# Altium footprint library BaseBoard.PcbLib: 128 footprints (part 2 of 8)
Each footprint in its own frame and in the unit in brackets; x right, y up, seen from the top. Pads: shape width x height; smd on the part's side, far side on the other; paste and mask are expansions set on the pad; w line width, h text height; cw(c..) or ccw(c..) is an arc to the next point about the centre after c.
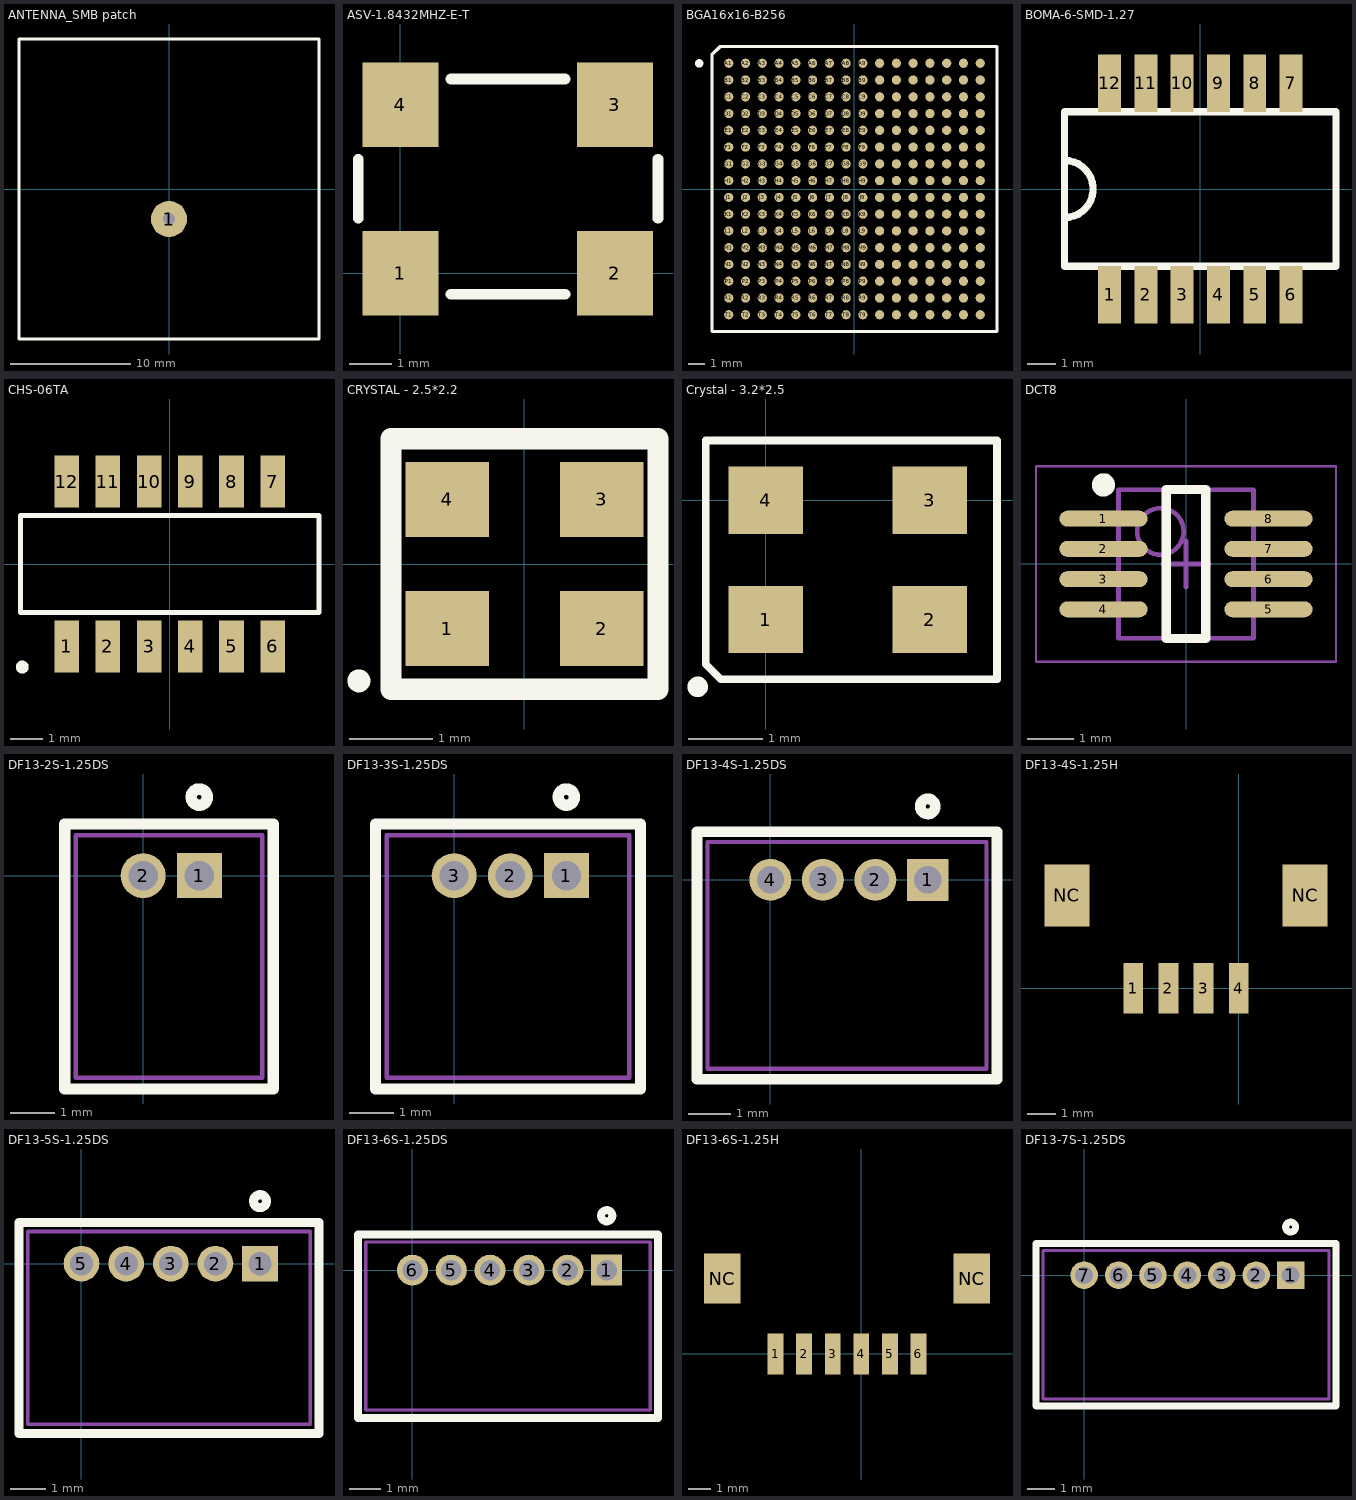
[diagram p1: the footprints below, top view; thin cyan lines are the x and y axes]

## ANTENNA_SMB patch [mm]
pads (1):
  round 3 hole 1: 1(0,-2.5)
Top Overlay:
  lines w0.254: -12.5,-12.5 12.5,-12.5 12.5,12.5 -12.5,12.5 -12.5,-12.5

## ASV-1.8432MHZ-E-T [mil]
pads (4):
  rect 71x79 smd: 1(0,0) 2(200,0) 3(200,157) 4(0,157)
Top Overlay:
  lines w10: -39.37,51.18 -39.37,106.3 ; 47.24,-19.68 153.54,-19.68 ; 47.24,181.1 153.54,181.1 ; 240.16,51.18 240.16,106.3
3D body "ASV.STEP": height 71.43, standoff 0.57, extent -37.39,-21.25 238.2,178.75

## BGA16x16-B256 [mm]
pads (256):
  round 0.55 smd: A1(-7.5,7.5) A2(-6.5,7.5) A3(-5.5,7.5) A4(-4.5,7.5) A5(-3.5,7.5) A6(-2.5,7.5) A7(-1.5,7.5) A8(-0.5,7.5) A9(0.5,7.5) A10(1.5,7.5) A11(2.5,7.5) A12(3.5,7.5) A13(4.5,7.5) A14(5.5,7.5) A15(6.5,7.5) A16(7.5,7.5) B1(-7.5,6.5) B2(-6.5,6.5) B3(-5.5,6.5) B4(-4.5,6.5) B5(-3.5,6.5) B6(-2.5,6.5) B7(-1.5,6.5) B8(-0.5,6.5) B9(0.5,6.5) B10(1.5,6.5) B11(2.5,6.5) B12(3.5,6.5) B13(4.5,6.5) B14(5.5,6.5) B15(6.5,6.5) B16(7.5,6.5) C1(-7.5,5.5) C2(-6.5,5.5) C3(-5.5,5.5) C4(-4.5,5.5) C5(-3.5,5.5) C6(-2.5,5.5) C7(-1.5,5.5) C8(-0.5,5.5) C9(0.5,5.5) C10(1.5,5.5) C11(2.5,5.5) C12(3.5,5.5) C13(4.5,5.5) C14(5.5,5.5) C15(6.5,5.5) C16(7.5,5.5) D1(-7.5,4.5) D2(-6.5,4.5) D3(-5.5,4.5) D4(-4.5,4.5) D5(-3.5,4.5) D6(-2.5,4.5) D7(-1.5,4.5) D8(-0.5,4.5) D9(0.5,4.5) D10(1.5,4.5) D11(2.5,4.5) D12(3.5,4.5) D13(4.5,4.5) D14(5.5,4.5) D15(6.5,4.5) D16(7.5,4.5) E1(-7.5,3.5) E2(-6.5,3.5) E3(-5.5,3.5) E4(-4.5,3.5) E5(-3.5,3.5) E6(-2.5,3.5) E7(-1.5,3.5) E8(-0.5,3.5) E9(0.5,3.5) E10(1.5,3.5) E11(2.5,3.5) E12(3.5,3.5) E13(4.5,3.5) E14(5.5,3.5) E15(6.5,3.5) E16(7.5,3.5) F1(-7.5,2.5) F2(-6.5,2.5) F3(-5.5,2.5) F4(-4.5,2.5) F5(-3.5,2.5) F6(-2.5,2.5) F7(-1.5,2.5) F8(-0.5,2.5) F9(0.5,2.5) F10(1.5,2.5) F11(2.5,2.5) F12(3.5,2.5) F13(4.5,2.5) F14(5.5,2.5) F15(6.5,2.5) F16(7.5,2.5) G1(-7.5,1.5) G2(-6.5,1.5) G3(-5.5,1.5) G4(-4.5,1.5) G5(-3.5,1.5) G6(-2.5,1.5) G7(-1.5,1.5) G8(-0.5,1.5) G9(0.5,1.5) G10(1.5,1.5) G11(2.5,1.5) G12(3.5,1.5) G13(4.5,1.5) G14(5.5,1.5) G15(6.5,1.5) G16(7.5,1.5) H1(-7.5,0.5) H2(-6.5,0.5) H3(-5.5,0.5) H4(-4.5,0.5) H5(-3.5,0.5) H6(-2.5,0.5) H7(-1.5,0.5) H8(-0.5,0.5) H9(0.5,0.5) H10(1.5,0.5) H11(2.5,0.5) H12(3.5,0.5) H13(4.5,0.5) H14(5.5,0.5) H15(6.5,0.5) H16(7.5,0.5) J1(-7.5,-0.5) J2(-6.5,-0.5) J3(-5.5,-0.5) J4(-4.5,-0.5) J5(-3.5,-0.5) J6(-2.5,-0.5) J7(-1.5,-0.5) J8(-0.5,-0.5) J9(0.5,-0.5) J10(1.5,-0.5) J11(2.5,-0.5) J12(3.5,-0.5) J13(4.5,-0.5) J14(5.5,-0.5) J15(6.5,-0.5) J16(7.5,-0.5) K1(-7.5,-1.5) K2(-6.5,-1.5) K3(-5.5,-1.5) K4(-4.5,-1.5) K5(-3.5,-1.5) K6(-2.5,-1.5) K7(-1.5,-1.5) K8(-0.5,-1.5) K9(0.5,-1.5) K10(1.5,-1.5) K11(2.5,-1.5) K12(3.5,-1.5) K13(4.5,-1.5) K14(5.5,-1.5) K15(6.5,-1.5) K16(7.5,-1.5) L1(-7.5,-2.5) L2(-6.5,-2.5) L3(-5.5,-2.5) L4(-4.5,-2.5) L5(-3.5,-2.5) L6(-2.5,-2.5) L7(-1.5,-2.5) L8(-0.5,-2.5) L9(0.5,-2.5) L10(1.5,-2.5) L11(2.5,-2.5) L12(3.5,-2.5) L13(4.5,-2.5) L14(5.5,-2.5) L15(6.5,-2.5) L16(7.5,-2.5) M1(-7.5,-3.5) M2(-6.5,-3.5) M3(-5.5,-3.5) M4(-4.5,-3.5) M5(-3.5,-3.5) M6(-2.5,-3.5) M7(-1.5,-3.5) M8(-0.5,-3.5) M9(0.5,-3.5) M10(1.5,-3.5) M11(2.5,-3.5) M12(3.5,-3.5) M13(4.5,-3.5) M14(5.5,-3.5) M15(6.5,-3.5) M16(7.5,-3.5) N1(-7.5,-4.5) N2(-6.5,-4.5) N3(-5.5,-4.5) N4(-4.5,-4.5) N5(-3.5,-4.5) N6(-2.5,-4.5) N7(-1.5,-4.5) N8(-0.5,-4.5) N9(0.5,-4.5) N10(1.5,-4.5) N11(2.5,-4.5) N12(3.5,-4.5) N13(4.5,-4.5) N14(5.5,-4.5) N15(6.5,-4.5) N16(7.5,-4.5) P1(-7.5,-5.5) P2(-6.5,-5.5) P3(-5.5,-5.5) P4(-4.5,-5.5) P5(-3.5,-5.5) P6(-2.5,-5.5) P7(-1.5,-5.5) P8(-0.5,-5.5) P9(0.5,-5.5) P10(1.5,-5.5) P11(2.5,-5.5) P12(3.5,-5.5) P13(4.5,-5.5) P14(5.5,-5.5) P15(6.5,-5.5) P16(7.5,-5.5) R1(-7.5,-6.5) R2(-6.5,-6.5) R3(-5.5,-6.5) R4(-4.5,-6.5) R5(-3.5,-6.5) R6(-2.5,-6.5) R7(-1.5,-6.5) R8(-0.5,-6.5) R9(0.5,-6.5) R10(1.5,-6.5) R11(2.5,-6.5) R12(3.5,-6.5) R13(4.5,-6.5) R14(5.5,-6.5) R15(6.5,-6.5) R16(7.5,-6.5) T1(-7.5,-7.5) T2(-6.5,-7.5) T3(-5.5,-7.5) T4(-4.5,-7.5) T5(-3.5,-7.5) T6(-2.5,-7.5) T7(-1.5,-7.5) T8(-0.5,-7.5) T9(0.5,-7.5) T10(1.5,-7.5) T11(2.5,-7.5) T12(3.5,-7.5) T13(4.5,-7.5) T14(5.5,-7.5) T15(6.5,-7.5) T16(7.5,-7.5)
Top Overlay:
  circle w0.25: c-9.269,7.493 r0.125
  lines w0.2: -8.5,-8.5 -8.5,8 -8,8.5 8.5,8.5 8.5,-8.5 -8.5,-8.5

## BOMA-6-SMD-1.27 [mm]
pads (12):
  rect 0.8x2 smd: 1(-3.175,-3.7) 2(-1.905,-3.7) 3(-0.635,-3.7) 4(0.635,-3.7) 5(1.905,-3.7) 6(3.175,-3.7) 7(3.175,3.7) 8(1.905,3.7) 9(0.635,3.7) 10(-0.635,3.7) 11(-1.905,3.7) 12(-3.175,3.7)
Top Overlay:
  lines w0.254: -4.75,-1 ccw(c-4.75,0) -4.75,1 ; -4.75,-2.7 -4.75,2.7 4.75,2.7 4.75,-2.7 -4.75,-2.7

## CHS-06TA [mm]
pads (12):
  rect 0.76x1.6 smd: 1(-3.175,-2.54) 2(-1.905,-2.54) 3(-0.635,-2.54) 4(0.635,-2.54) 5(1.905,-2.54) 6(3.175,-2.54) 7(3.175,2.54) 8(1.905,2.54) 9(0.635,2.54) 10(-0.635,2.54) 11(-1.905,2.54) 12(-3.175,2.54)
Top Overlay:
  circle w0.2: c-4.545,-3.175 r0.1
  lines w0.152: -4.6,-1.5 -4.6,1.5 4.6,1.5 4.6,-1.5 -4.6,-1.5

## CRYSTAL - 2.5*2.2 [mm] "2.5 * 2, 24MHz,"
pads (4):
  rect 1x0.9 smd: 1(-0.925,-0.775) 2(0.925,-0.775) 3(0.925,0.775) 4(-0.925,0.775)
Top Overlay:
  circle w0.254: c-1.985,-1.4 r0.01
  lines w0.254: -1.6,-1.5 -1.6,1.5 1.6,1.5 1.6,-1.5 -1.6,-1.5

## Crystal - 3.2*2.5 [mm] "SMD Crystal. 20MHz"
pads (4):
  rect 1x0.9 smd: 1(0,-1.6) 2(2.2,-1.6) 3(2.2,0) 4(0,0)
Top Overlay:
  circle w0.254: c-0.91,-2.5 r0.01
  lines w0.102: -0.8,-2.2 -0.8,0.8 3.1,0.8 3.1,-2.4 -0.6,-2.4 -0.8,-2.2

## DCT8 [mm] "TSOP, 8-Leads, Body 2.95x2.80mm, Pitch 0.65mm, IPC Low Density"
height 1.3
pads (8):
  oval 1.9x0.34 smd: 1(-1.775,0.975) 2(-1.775,0.325) 3(-1.775,-0.325) 4(-1.775,-0.975) 5(1.775,-0.975) 6(1.775,-0.325) 7(1.775,0.325) 8(1.775,0.975)
Top Overlay:
  circle w0.25: c-1.775,1.7 r0.125
  lines w0.2: -0.425,-1.6 -0.425,1.6 0.425,1.6 0.425,-1.6 -0.425,-1.6
Mechanical 13:
  circle w0.1: c-0.55,0.7 r0.5
  lines w0.1: -1.45,-1.6 -1.45,1.6 1.45,1.6 1.45,-1.6 -1.45,-1.6
Mechanical 15:
  lines w0.05: -3.225,-2.1 -3.225,2.1 3.225,2.1 3.225,-2.1 -3.225,-2.1
  lines w0.1: -0.5,0 0.5,0 ; 0,-0.5 0,0.5
3D body: height 1.3, standoff 0.1, extent -1.45,-1.6 1.45,1.6

## DF13-2S-1.25DS [mm] "DF13 2pin through hole, 1.25mm"
pads (2):
  rect 1x1 hole 0.65: 1(1.25,0)
  round 1 hole 0.65: 2(0,0)
Top Overlay:
  circle w0.254: c1.25,1.75 r0.18
  lines w0.254: -1.75,-4.75 2.9,-4.75 2.9,1.15 -1.75,1.15 -1.75,-4.75
Mechanical 13:
  lines w0.1: -1.5,-4.5 -1.5,0.9 2.65,0.9 2.65,-4.5 -1.5,-4.5
3D body: height 3.6, standoff 0, extent -1.55,-4.55 2.7,0.95

## DF13-3S-1.25DS [mm] "DF13 3pin through hole 1.25mm"
pads (3):
  rect 1x1 hole 0.65: 1(2.5,0)
  round 1 hole 0.65: 2(1.25,0) 3(0,0)
Top Overlay:
  circle w0.254: c2.5,1.75 r0.18
  lines w0.254: -1.75,-4.75 -1.75,1.15 4.15,1.15 4.15,-4.75 -1.75,-4.75
Mechanical 13:
  lines w0.1: -1.5,-4.5 3.9,-4.5 3.9,0.9 -1.5,0.9 -1.5,-4.5
3D body: height 3.6, standoff 0, extent -1.55,-4.55 3.95,0.95

## DF13-4S-1.25DS [mm] "DF13, 4 pin through hole 1.25mm"
pads (4):
  rect 1x1 hole 0.65: 1(3.75,0)
  round 1 hole 0.65: 2(2.5,0) 3(1.25,0) 4(0,0)
Top Overlay:
  circle w0.254: c3.75,1.75 r0.18
  lines w0.254: -1.75,-4.75 5.4,-4.75 5.4,1.15 -1.75,1.15 -1.75,-4.75
Mechanical 13:
  lines w0.1: -1.5,-4.5 -1.5,0.9 5.15,0.9 5.15,-4.5 -1.5,-4.5

## DF13-4S-1.25H [mm] "Hirose DF13 horizontal SMD 4 pin"
pads (6):
  rect 0.7x1.8 smd: 1(-3.75,0) 2(-2.5,0) 3(-1.25,0) 4(0,0)
  rect 1.6x2.2 smd: NC(-6.1,3.3) NC(2.35,3.3)
3D body "DF13A-4P-1.25H.stp": height 3.58, standoff -0.02, extent -6.7,-0.5 2.95,6

## DF13-5S-1.25DS [mm] "DF13 5 pin through hole, 1.25mm"
pads (5):
  rect 1x1 hole 0.65: 1(5,0)
  round 1 hole 0.65: 2(3.75,0) 3(2.5,0) 4(1.25,0) 5(0,0)
Top Overlay:
  circle w0.254: c5,1.75 r0.18
  lines w0.254: -1.75,-4.75 6.65,-4.75 6.65,1.15 -1.75,1.15 -1.75,-4.75
Mechanical 13:
  lines w0.1: -1.5,-4.5 -1.5,0.9 6.4,0.9 6.4,-4.5 -1.5,-4.5
3D body: height 3.6, standoff 0, extent -1.55,-4.55 6.45,0.95

## DF13-6S-1.25DS [mm] "DF13, 6 pin through hole 1.25mm"
pads (6):
  rect 1x1 hole 0.65: 1(6.25,0)
  round 1 hole 0.65: 2(5,0) 3(3.75,0) 4(2.5,0) 5(1.25,0) 6(0,0)
Top Overlay:
  circle w0.254: c6.25,1.75 r0.18
  lines w0.254: -1.75,-4.75 -1.75,1.15 7.9,1.15 7.9,-4.75 -1.75,-4.75
Mechanical 13:
  lines w0.1: -1.5,-4.5 7.65,-4.5 7.65,0.9 -1.5,0.9 -1.5,-4.5
3D body: height 3.6, standoff 0, extent -1.55,-4.55 7.7,0.95

## DF13-6S-1.25H [mm] "Hirose DF13 Horisontal SMD 6 pin"
pads (8):
  rect 0.7x1.8 smd: 1(-3.75,0) 2(-2.5,0) 3(-1.25,0) 4(0,0) 5(1.25,0) 6(2.5,0)
  rect 1.6x2.2 smd: NC(-6.1,3.3) NC(4.85,3.3)
3D body "DF13A-6P-1.25H.stp": height 3.58, standoff -0.02, extent -6.7,-0.5 5.45,6

## DF13-7S-1.25DS [mm] "DF13, 7 pin through hole, 1.25mm"
pads (7):
  rect 1x1 hole 0.65: 1(7.5,0)
  round 1 hole 0.65: 2(6.25,0) 3(5,0) 4(3.75,0) 5(2.5,0) 6(1.25,0) 7(0,0)
Top Overlay:
  circle w0.254: c7.5,1.75 r0.18
  lines w0.254: -1.75,-4.75 -1.75,1.15 9.15,1.15 9.15,-4.75 -1.75,-4.75
Mechanical 13:
  lines w0.1: -1.5,-4.5 8.9,-4.5 8.9,0.9 -1.5,0.9 -1.5,-4.5
3D body: height 3.6, standoff 0, extent -1.55,-4.55 8.95,0.95